# Altium schematic symbol library Capacitor - Aluminium TH.SchLib: 4591 symbols (part 21 of 27) (continued)
## UPM1J331MHD1TO (continued)
CAP ALUM 330UF 20% 63V RADIAL; Part Number: UPM1J331MHD1TO; Manufacturer: Nichicon; TemperatureRange: -55C ~ 105C; Type: Polar; Ripple Current: 1.09A @ 120Hz; Impedance: 49 mOhm; Value: 330uF; PartId: 23962; Supplier 1: Digi-Key; Supplier Part Number 1: 493-12152-1-ND; ComponentLink1Description: Datasheet; ComponentLink1URL: http://nichicon-us.com/english/products/pdfs/e-upm.pdf; ComponentLink2Description: Digi-Key Listing; ComponentLink2URL: https://www.digikey.com/product-detail/en/nichicon/UPM1J331MHD1TO/493-12152-1-ND/4319624; Tolerance: 20%; Voltage: 63V; Price: 0.98; Device Package: Radial, Can, 12.5mm
footprint CAP AL TH D12.5 L5 H27
pins: 1, 2

## UPM1J391MHD
designator C?, comment 390uF  (value not drawn)
CAP ALUM 390UF 20% 63V RADIAL; Part Number: UPM1J391MHD; Manufacturer: Nichicon; TemperatureRange: -55C ~ 105C; Type: Polar; Ripple Current: 1.26A @ 120Hz; Impedance: 43 mOhm; Value: 390uF; PartId: 24259; Supplier 1: Digi-Key; Supplier Part Number 1: 493-5618-ND; ComponentLink1Description: Datasheet; ComponentLink1URL: http://nichicon-us.com/english/products/pdfs/e-upm.pdf; ComponentLink2Description: Digi-Key Listing; ComponentLink2URL: https://www.digikey.com/product-detail/en/nichicon/UPM1J391MHD/493-5618-ND/2599683; Tolerance: 20%; Voltage: 63V; Price: 1.03; Device Package: Radial, Can, 12.5mm
footprint CAP AL TH D12.5 L5 H35.5
pins: 1, 2

## UPM1J471MHD6TN
designator C?, comment 470uF  (value not drawn)
CAP ALUM 470UF 20% 63V RADIAL; Part Number: UPM1J471MHD6TN; Manufacturer: Nichicon; TemperatureRange: -55C ~ 105C; Type: Polar; Ripple Current: 1.36A @ 120Hz; Impedance: 42 mOhm; Value: 470uF; PartId: 26772; Supplier 1: Digi-Key; Supplier Part Number 1: 493-7403-3-ND; ComponentLink1Description: Datasheet; ComponentLink1URL: http://nichicon-us.com/english/products/pdfs/e-upm.pdf; ComponentLink2Description: Digi-Key Listing; ComponentLink2URL: https://www.digikey.com/product-detail/en/nichicon/UPM1J471MHD6TN/493-7403-3-ND/3768716; Tolerance: 20%; Voltage: 63V; Price: 0.62; Device Package: Radial, Can, 16mm
footprint CAP AL TH D16 L7.5 H27
pins: 1, 2

## UPM1J560MPD6TD
designator C?, comment 56uF  (value not drawn)
CAP ALUM 56UF 20% 63V RADIAL; Part Number: UPM1J560MPD6TD; Manufacturer: Nichicon; TemperatureRange: -55C ~ 105C; Type: Polar; Ripple Current: 275mA @ 120Hz; Impedance: 230 mOhm; Value: 56uF; PartId: 24894; Supplier 1: Digi-Key; Supplier Part Number 1: 493-11793-1-ND; ComponentLink1Description: Datasheet; ComponentLink1URL: http://nichicon-us.com/english/products/pdfs/e-upm.pdf; ComponentLink2Description: Digi-Key Listing; ComponentLink2URL: https://www.digikey.com/product-detail/en/nichicon/UPM1J560MPD6TD/493-11793-1-ND/4319630; Tolerance: 20%; Voltage: 63V; Price: 0.48; Device Package: Radial, Can, 10mm
footprint CAP AL TH D10 L5 H14.5
pins: 1, 2

## UPM1J680MPD6TD
designator C?, comment 68uF  (value not drawn)
CAP ALUM 68UF 20% 63V RADIAL; Part Number: UPM1J680MPD6TD; Manufacturer: Nichicon; TemperatureRange: -55C ~ 105C; Type: Polar; Ripple Current: 310mA @ 120Hz; Impedance: 190 mOhm; Value: 68uF; PartId: 24577; Supplier 1: Digi-Key; Supplier Part Number 1: 493-11835-3-ND; ComponentLink1Description: Datasheet; ComponentLink1URL: http://nichicon-us.com/english/products/pdfs/e-upm.pdf; ComponentLink2Description: Digi-Key Listing; ComponentLink2URL: https://www.digikey.com/product-detail/en/nichicon/UPM1J680MPD6TD/493-11835-3-ND/4320978; Tolerance: 20%; Voltage: 63V; Price: 0.1612; Device Package: Radial, Can, 10mm
footprint CAP AL TH D10 L5 H14.5
pins: 1, 2

## UPM1J681MHD
designator C?, comment 680uF  (value not drawn)
CAP ALUM 680UF 20% 63V RADIAL; Part Number: UPM1J681MHD; Manufacturer: Nichicon; TemperatureRange: -55C ~ 105C; Type: Polar; Ripple Current: 1.7A @ 120Hz; Impedance: 32 mOhm; Value: 680uF; PartId: 27020; Supplier 1: Digi-Key; Supplier Part Number 1: 493-5619-ND; ComponentLink1Description: Datasheet; ComponentLink1URL: http://nichicon-us.com/english/products/pdfs/e-upm.pdf; ComponentLink2Description: Digi-Key Listing; ComponentLink2URL: https://www.digikey.com/product-detail/en/nichicon/UPM1J681MHD/493-5619-ND/2599693; Tolerance: 20%; Voltage: 63V; Price: 1.45; Device Package: Radial, Can, 16mm
footprint CAP AL TH D16 L7.5 H33.5
pins: 1, 2

## UPM1J820MPD6TD
designator C?, comment 82uF  (value not drawn)
CAP ALUM 82UF 20% 63V RADIAL; Part Number: UPM1J820MPD6TD; Manufacturer: Nichicon; TemperatureRange: -55C ~ 105C; Type: Polar; Ripple Current: 375mA @ 120Hz; Impedance: 160 mOhm; Value: 82uF; PartId: 25066; Supplier 1: Digi-Key; Supplier Part Number 1: 493-5266-3-ND; ComponentLink1Description: Datasheet; ComponentLink1URL: http://nichicon-us.com/english/products/pdfs/e-upm.pdf; ComponentLink2Description: Digi-Key Listing; ComponentLink2URL: https://www.digikey.com/product-detail/en/nichicon/UPM1J820MPD6TD/493-5266-3-ND/3130271; Tolerance: 20%; Voltage: 63V; Price: 0.225; Device Package: Radial, Can, 10mm
footprint CAP AL TH D10 L5 H17.5
pins: 1, 2

## UPM1K101MHD6TO
designator C?, comment 100uF  (value not drawn)
CAP ALUM 100UF 20% 80V RADIAL; Part Number: UPM1K101MHD6TO; Manufacturer: Nichicon; TemperatureRange: -55C ~ 105C; Type: Polar; Ripple Current: 400mA @ 120Hz; Impedance: 230 mOhm; Value: 100uF; PartId: 22812; Supplier 1: Digi-Key; Supplier Part Number 1: 493-12056-1-ND; ComponentLink1Description: Datasheet; ComponentLink1URL: http://nichicon-us.com/english/products/pdfs/e-upm.pdf; ComponentLink2Description: Digi-Key Listing; ComponentLink2URL: https://www.digikey.com/product-detail/en/nichicon/UPM1K101MHD6TO/493-12056-1-ND/4319634; Tolerance: 20%; Voltage: 80V; Price: 0; Device Package: Radial, Can, 12.5mm
footprint CAP AL TH D12.5 L5 H17.5
pins: 1, 2

## UPM1K121MHD6TN
designator C?, comment 120uF  (value not drawn)
CAP ALUM 120UF 20% 80V RADIAL; Part Number: UPM1K121MHD6TN; Manufacturer: Nichicon; TemperatureRange: -55C ~ 105C; Type: Polar; Ripple Current: 445mA @ 120Hz; Impedance: 200 mOhm; Value: 120uF; PartId: 26268; Supplier 1: Digi-Key; Supplier Part Number 1: 493-5269-3-ND; ComponentLink1Description: Datasheet; ComponentLink1URL: http://nichicon-us.com/english/products/pdfs/e-upm.pdf; ComponentLink2Description: Digi-Key Listing; ComponentLink2URL: https://www.digikey.com/product-detail/en/nichicon/UPM1K121MHD6TN/493-5269-3-ND/3130274; Tolerance: 20%; Voltage: 80V; Price: 0.514; Device Package: Radial, Can, 16mm
footprint CAP AL TH D16 L7.5 H20
pins: 1, 2

## UPM1K151MHD6TN
designator C?, comment 150uF  (value not drawn)
CAP ALUM 150UF 20% 80V RADIAL; Part Number: UPM1K151MHD6TN; Manufacturer: Nichicon; TemperatureRange: -55C ~ 105C; Type: Polar; Ripple Current: 470mA @ 120Hz; Impedance: 180 mOhm; Value: 150uF; PartId: 26275; Supplier 1: Digi-Key; Supplier Part Number 1: 493-5271-3-ND; ComponentLink1Description: Datasheet; ComponentLink1URL: http://nichicon-us.com/english/products/pdfs/e-upm.pdf; ComponentLink2Description: Digi-Key Listing; ComponentLink2URL: https://www.digikey.com/product-detail/en/nichicon/UPM1K151MHD6TN/493-5271-3-ND/3130276; Tolerance: 20%; Voltage: 80V; Price: 0.5838; Device Package: Radial, Can, 16mm
footprint CAP AL TH D16 L7.5 H20
pins: 1, 2

## UPM1K181MHD1TO
designator C?, comment 180uF  (value not drawn)
CAP ALUM 180UF 20% 80V RADIAL; Part Number: UPM1K181MHD1TO; Manufacturer: Nichicon; TemperatureRange: -55C ~ 105C; Type: Polar; Ripple Current: 735mA @ 120Hz; Impedance: 130 mOhm; Value: 180uF; PartId: 23826; Supplier 1: Digi-Key; Supplier Part Number 1: 493-5273-3-ND; ComponentLink1Description: Datasheet; ComponentLink1URL: http://nichicon-us.com/english/products/pdfs/e-upm.pdf; ComponentLink2Description: Digi-Key Listing; ComponentLink2URL: https://www.digikey.com/product-detail/en/nichicon/UPM1K181MHD1TO/493-5273-3-ND/3130278; Tolerance: 20%; Voltage: 80V; Price: 0.4493; Device Package: Radial, Can, 12.5mm
footprint CAP AL TH D12.5 L5 H27
pins: 1, 2

## UPM1K221MHD
designator C?, comment 220uF  (value not drawn)
CAP ALUM 220UF 20% 80V RADIAL; Part Number: UPM1K221MHD; Manufacturer: Nichicon; TemperatureRange: -55C ~ 105C; Type: Polar; Ripple Current: 845mA @ 120Hz; Impedance: 120 mOhm; Value: 220uF; PartId: 24234; Supplier 1: Digi-Key; Supplier Part Number 1: 493-5622-ND; ComponentLink1Description: Datasheet; ComponentLink1URL: http://nichicon-us.com/english/products/pdfs/e-upm.pdf; ComponentLink2Description: Digi-Key Listing; ComponentLink2URL: https://www.digikey.com/product-detail/en/nichicon/UPM1K221MHD/493-5622-ND/2599713; Tolerance: 20%; Voltage: 80V; Price: 0.98; Device Package: Radial, Can, 12.5mm
footprint CAP AL TH D12.5 L5 H35.5
pins: 1, 2

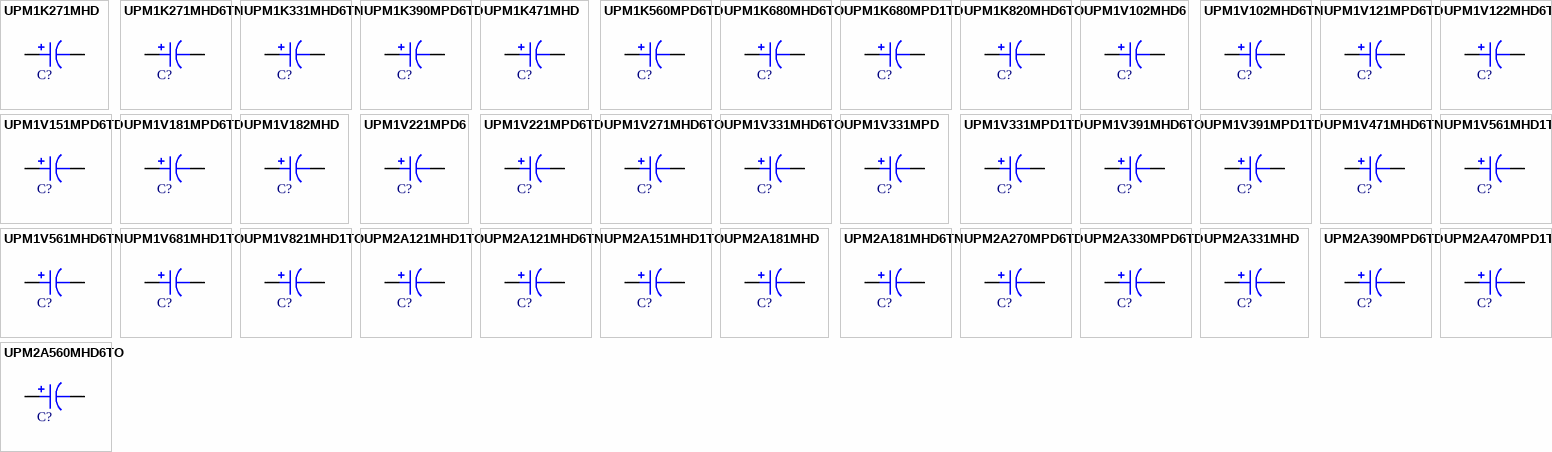
[diagram p88: symbols UPM1K271MHD to UPM2A560MHD6TO]

## UPM1K271MHD
designator C?, comment 270uF  (value not drawn)
CAP ALUM 270UF 20% 80V RADIAL; Part Number: UPM1K271MHD; Manufacturer: Nichicon; TemperatureRange: -55C ~ 105C; Type: Polar; Ripple Current: 945mA @ 120Hz; Impedance: 100 mOhm; Value: 270uF; PartId: 24273; Supplier 1: Digi-Key; Supplier Part Number 1: 493-5623-ND; ComponentLink1Description: Datasheet; ComponentLink1URL: http://nichicon-us.com/english/products/pdfs/e-upm.pdf; ComponentLink2Description: Digi-Key Listing; ComponentLink2URL: https://www.digikey.com/product-detail/en/nichicon/UPM1K271MHD/493-5623-ND/2599716; Tolerance: 20%; Voltage: 80V; Price: 1.06; Device Package: Radial, Can, 12.5mm
footprint CAP AL TH D12.5 L5 H35.5
pins: 1, 2

## UPM1K271MHD6TN
designator C?, comment 270uF  (value not drawn)
CAP ALUM 270UF 20% 80V RADIAL; Part Number: UPM1K271MHD6TN; Manufacturer: Nichicon; TemperatureRange: -55C ~ 105C; Type: Polar; Ripple Current: 920mA @ 120Hz; Impedance: 110 mOhm; Value: 270uF; PartId: 26353; Supplier 1: Digi-Key; Supplier Part Number 1: 493-5276-3-ND; ComponentLink1Description: Datasheet; ComponentLink1URL: http://nichicon-us.com/english/products/pdfs/e-upm.pdf; ComponentLink2Description: Digi-Key Listing; ComponentLink2URL: https://www.digikey.com/product-detail/en/nichicon/UPM1K271MHD6TN/493-5276-3-ND/3130281; Tolerance: 20%; Voltage: 80V; Price: 0.5065; Device Package: Radial, Can, 16mm
footprint CAP AL TH D16 L7.5 H22
pins: 1, 2

## UPM1K331MHD6TN
designator C?, comment 330uF  (value not drawn)
CAP ALUM 330UF 20% 80V RADIAL; Part Number: UPM1K331MHD6TN; Manufacturer: Nichicon; TemperatureRange: -55C ~ 105C; Type: Polar; Ripple Current: 1.1A @ 120Hz; Impedance: 99 mOhm; Value: 330uF; PartId: 26776; Supplier 1: Digi-Key; Supplier Part Number 1: 493-5277-3-ND; ComponentLink1Description: Datasheet; ComponentLink1URL: http://nichicon-us.com/english/products/pdfs/e-upm.pdf; ComponentLink2Description: Digi-Key Listing; ComponentLink2URL: https://www.digikey.com/product-detail/en/nichicon/UPM1K331MHD6TN/493-5277-3-ND/3130282; Tolerance: 20%; Voltage: 80V; Price: 0.6296; Device Package: Radial, Can, 16mm
footprint CAP AL TH D16 L7.5 H27
pins: 1, 2

## UPM1K390MPD6TD
designator C?, comment 39uF  (value not drawn)
CAP ALUM 39UF 20% 80V RADIAL; Part Number: UPM1K390MPD6TD; Manufacturer: Nichicon; TemperatureRange: -55C ~ 105C; Type: Polar; Ripple Current: 215mA @ 120Hz; Impedance: 490 mOhm; Value: 39uF; PartId: 24548; Supplier 1: Digi-Key; Supplier Part Number 1: 493-5279-3-ND; ComponentLink1Description: Datasheet; ComponentLink1URL: http://nichicon-us.com/english/products/pdfs/e-upm.pdf; ComponentLink2Description: Digi-Key Listing; ComponentLink2URL: https://www.digikey.com/product-detail/en/nichicon/UPM1K390MPD6TD/493-5279-3-ND/3130284; Tolerance: 20%; Voltage: 80V; Price: 0.148; Device Package: Radial, Can, 10mm
footprint CAP AL TH D10 L5 H14.5
pins: 1, 2

## UPM1K471MHD
designator C?, comment 470uF  (value not drawn)
CAP ALUM 470UF 20% 80V RADIAL; Part Number: UPM1K471MHD; Manufacturer: Nichicon; TemperatureRange: -55C ~ 105C; Type: Polar; Ripple Current: 1.43A @ 120Hz; Impedance: 69 mOhm; Value: 470uF; PartId: 27153; Supplier 1: Digi-Key; Supplier Part Number 1: 493-11131-ND; ComponentLink1Description: Datasheet; ComponentLink1URL: http://nichicon-us.com/english/products/pdfs/e-upm.pdf; ComponentLink2Description: Digi-Key Listing; ComponentLink2URL: https://www.digikey.com/product-detail/en/nichicon/UPM1K471MHD/493-11131-ND/2599727; Tolerance: 20%; Voltage: 80V; Price: 1.85; Device Package: Radial, Can, 16mm
footprint CAP AL TH D16 L7.5 H33.5
pins: 1, 2

## UPM1K560MPD6TD
designator C?, comment 56uF  (value not drawn)
CAP ALUM 56UF 20% 80V RADIAL; Part Number: UPM1K560MPD6TD; Manufacturer: Nichicon; TemperatureRange: -55C ~ 105C; Type: Polar; Ripple Current: 305mA @ 120Hz; Impedance: 360 mOhm; Value: 56uF; PartId: 25043; Supplier 1: Digi-Key; Supplier Part Number 1: 493-11901-3-ND; ComponentLink1Description: Datasheet; ComponentLink1URL: http://nichicon-us.com/english/products/pdfs/e-upm.pdf; ComponentLink2Description: Digi-Key Listing; ComponentLink2URL: https://www.digikey.com/product-detail/en/nichicon/UPM1K560MPD6TD/493-11901-3-ND/4321044; Tolerance: 20%; Voltage: 80V; Price: 0.192; Device Package: Radial, Can, 10mm
footprint CAP AL TH D10 L5 H17.5
pins: 1, 2

## UPM1K680MHD6TO
designator C?, comment 68uF  (value not drawn)
CAP ALUM 68UF 20% 80V RADIAL; Part Number: UPM1K680MHD6TO; Manufacturer: Nichicon; TemperatureRange: -55C ~ 105C; Type: Polar; Ripple Current: 325mA @ 120Hz; Impedance: 310 mOhm; Value: 68uF; PartId: 22809; Supplier 1: Digi-Key; Supplier Part Number 1: 493-5283-1-ND; ComponentLink1Description: Datasheet; ComponentLink1URL: http://nichicon-us.com/english/products/pdfs/e-upm.pdf; ComponentLink2Description: Digi-Key Listing; ComponentLink2URL: https://www.digikey.com/product-detail/en/nichicon/UPM1K680MHD6TO/493-5283-1-ND/3129620; Tolerance: 20%; Voltage: 80V; Price: 0; Device Package: Radial, Can, 12.5mm
footprint CAP AL TH D12.5 L5 H17.5
pins: 1, 2

## UPM1K680MPD1TD
designator C?, comment 68uF  (value not drawn)
CAP ALUM 68UF 20% 80V RADIAL; Part Number: UPM1K680MPD1TD; Manufacturer: Nichicon; TemperatureRange: -55C ~ 105C; Type: Polar; Ripple Current: 355mA @ 120Hz; Impedance: 280 mOhm; Value: 68uF; PartId: 25765; Supplier 1: Digi-Key; Supplier Part Number 1: 493-5284-3-ND; ComponentLink1Description: Datasheet; ComponentLink1URL: http://nichicon-us.com/english/products/pdfs/e-upm.pdf; ComponentLink2Description: Digi-Key Listing; ComponentLink2URL: https://www.digikey.com/product-detail/en/nichicon/UPM1K680MPD1TD/493-5284-3-ND/3130289; Tolerance: 20%; Voltage: 80V; Price: 0.2206; Device Package: Radial, Can, 10mm
footprint CAP AL TH D10 L5 H22
pins: 1, 2

## UPM1K820MHD6TO
designator C?, comment 82uF  (value not drawn)
CAP ALUM 82UF 20% 80V RADIAL; Part Number: UPM1K820MHD6TO; Manufacturer: Nichicon; TemperatureRange: -55C ~ 105C; Type: Polar; Ripple Current: 355mA @ 120Hz; Impedance: 270 mOhm; Value: 82uF; PartId: 22811; Supplier 1: Digi-Key; Supplier Part Number 1: 493-5286-1-ND; ComponentLink1Description: Datasheet; ComponentLink1URL: http://nichicon-us.com/english/products/pdfs/e-upm.pdf; ComponentLink2Description: Digi-Key Listing; ComponentLink2URL: https://www.digikey.com/product-detail/en/nichicon/UPM1K820MHD6TO/493-5286-1-ND/3129623; Tolerance: 20%; Voltage: 80V; Price: 0; Device Package: Radial, Can, 12.5mm
footprint CAP AL TH D12.5 L5 H17.5
pins: 1, 2

## UPM1V102MHD6
designator C?, comment 1000uF  (value not drawn)
CAP ALUM 1000UF 20% 35V RADIAL; Part Number: UPM1V102MHD6; Manufacturer: Nichicon; TemperatureRange: -55C ~ 105C; Type: Polar; Ripple Current: 1.53A @ 120Hz; Impedance: 34 mOhm; Value: 1000uF; PartId: 26441; Supplier 1: Digi-Key; Supplier Part Number 1: UPM1V102MHD6-ND; ComponentLink1Description: Datasheet; ComponentLink1URL: http://nichicon-us.com/english/products/pdfs/e-upm.pdf; ComponentLink2Description: Digi-Key Listing; ComponentLink2URL: https://www.digikey.com/product-detail/en/nichicon/UPM1V102MHD6/UPM1V102MHD6-ND/2599743; Tolerance: 20%; Voltage: 35V; Price: 1.37; Device Package: Radial, Can, 16mm
footprint CAP AL TH D16 L7.5 H22
pins: 1, 2

## UPM1V102MHD6TN
designator C?, comment 1000uF  (value not drawn)
CAP ALUM 1000UF 20% 35V RADIAL; Part Number: UPM1V102MHD6TN; Manufacturer: Nichicon; TemperatureRange: -55C ~ 105C; Type: Polar; Ripple Current: 1.53A @ 120Hz; Impedance: 34 mOhm; Value: 1000uF; PartId: 26371; Supplier 1: Digi-Key; Supplier Part Number 1: 493-12252-3-ND; ComponentLink1Description: Datasheet; ComponentLink1URL: http://nichicon-us.com/english/products/pdfs/e-upm.pdf; ComponentLink2Description: Digi-Key Listing; ComponentLink2URL: https://www.digikey.com/product-detail/en/nichicon/UPM1V102MHD6TN/493-12252-3-ND/4321395; Tolerance: 20%; Voltage: 35V; Price: 0.5792; Device Package: Radial, Can, 16mm
footprint CAP AL TH D16 L7.5 H22
pins: 1, 2

## UPM1V121MPD6TD
designator C?, comment 120uF  (value not drawn)
CAP ALUM 120UF 20% 35V RADIAL; Part Number: UPM1V121MPD6TD; Manufacturer: Nichicon; TemperatureRange: -55C ~ 105C; Type: Polar; Ripple Current: 425mA @ 120Hz; Impedance: 150 mOhm; Value: 120uF; PartId: 24550; Supplier 1: Digi-Key; Supplier Part Number 1: 493-5288-3-ND; ComponentLink1Description: Datasheet; ComponentLink1URL: http://nichicon-us.com/english/products/pdfs/e-upm.pdf; ComponentLink2Description: Digi-Key Listing; ComponentLink2URL: https://www.digikey.com/product-detail/en/nichicon/UPM1V121MPD6TD/493-5288-3-ND/3130293; Tolerance: 20%; Voltage: 35V; Price: 0.1484; Device Package: Radial, Can, 10mm
footprint CAP AL TH D10 L5 H14.5
pins: 1, 2

## UPM1V122MHD6TN
designator C?, comment 1200uF  (value not drawn)
CAP ALUM 1200UF 20% 35V RADIAL; Part Number: UPM1V122MHD6TN; Manufacturer: Nichicon; TemperatureRange: -55C ~ 105C; Type: Polar; Ripple Current: 1.92A @ 120Hz; Impedance: 31 mOhm; Value: 1200uF; PartId: 26783; Supplier 1: Digi-Key; Supplier Part Number 1: 493-5289-3-ND; ComponentLink1Description: Datasheet; ComponentLink1URL: http://nichicon-us.com/english/products/pdfs/e-upm.pdf; ComponentLink2Description: Digi-Key Listing; ComponentLink2URL: https://www.digikey.com/product-detail/en/nichicon/UPM1V122MHD6TN/493-5289-3-ND/3130294; Tolerance: 20%; Voltage: 35V; Price: 0.6568; Device Package: Radial, Can, 16mm
footprint CAP AL TH D16 L7.5 H27
pins: 1, 2

## UPM1V151MPD6TD
designator C?, comment 150uF  (value not drawn)
CAP ALUM 150UF 20% 35V RADIAL; Part Number: UPM1V151MPD6TD; Manufacturer: Nichicon; TemperatureRange: -55C ~ 105C; Type: Polar; Ripple Current: 475mA @ 120Hz; Impedance: 120 mOhm; Value: 150uF; PartId: 24546; Supplier 1: Digi-Key; Supplier Part Number 1: 493-11795-3-ND; ComponentLink1Description: Datasheet; ComponentLink1URL: http://nichicon-us.com/english/products/pdfs/e-upm.pdf; ComponentLink2Description: Digi-Key Listing; ComponentLink2URL: https://www.digikey.com/product-detail/en/nichicon/UPM1V151MPD6TD/493-11795-3-ND/4320938; Tolerance: 20%; Voltage: 35V; Price: 0.148; Device Package: Radial, Can, 10mm
footprint CAP AL TH D10 L5 H14.5
pins: 1, 2

## UPM1V181MPD6TD
designator C?, comment 180uF  (value not drawn)
CAP ALUM 180UF 20% 35V RADIAL; Part Number: UPM1V181MPD6TD; Manufacturer: Nichicon; TemperatureRange: -55C ~ 105C; Type: Polar; Ripple Current: 500mA @ 120Hz; Impedance: 110 mOhm; Value: 180uF; PartId: 25050; Supplier 1: Digi-Key; Supplier Part Number 1: 493-5290-3-ND; ComponentLink1Description: Datasheet; ComponentLink1URL: http://nichicon-us.com/english/products/pdfs/e-upm.pdf; ComponentLink2Description: Digi-Key Listing; ComponentLink2URL: https://www.digikey.com/product-detail/en/nichicon/UPM1V181MPD6TD/493-5290-3-ND/3130295; Tolerance: 20%; Voltage: 35V; Price: 0.2038; Device Package: Radial, Can, 10mm
footprint CAP AL TH D10 L5 H17.5
pins: 1, 2

## UPM1V182MHD
designator C?, comment 1800uF  (value not drawn)
CAP ALUM 1800UF 20% 35V RADIAL; Part Number: UPM1V182MHD; Manufacturer: Nichicon; TemperatureRange: -55C ~ 105C; Type: Polar; Ripple Current: 2.25A @ 120Hz; Impedance: 22 mOhm; Value: 1800uF; PartId: 27163; Supplier 1: Digi-Key; Supplier Part Number 1: 493-11132-ND; ComponentLink1Description: Datasheet; ComponentLink1URL: http://nichicon-us.com/english/products/pdfs/e-upm.pdf; ComponentLink2Description: Digi-Key Listing; ComponentLink2URL: https://www.digikey.com/product-detail/en/nichicon/UPM1V182MHD/493-11132-ND/2599753; Tolerance: 20%; Voltage: 35V; Price: 1.87; Device Package: Radial, Can, 16mm
footprint CAP AL TH D16 L7.5 H33.5
pins: 1, 2

## UPM1V221MPD6
designator C?, comment 220uF  (value not drawn)
CAP ALUM 220UF 20% 35V RADIAL; Part Number: UPM1V221MPD6; Manufacturer: Nichicon; TemperatureRange: -55C ~ 105C; Type: Polar; Ripple Current: 600mA @ 120Hz; Impedance: 90 mOhm; Value: 220uF; PartId: 25275; Supplier 1: Digi-Key; Supplier Part Number 1: UPM1V221MPD6-ND; ComponentLink1Description: Datasheet; ComponentLink1URL: http://nichicon-us.com/english/products/pdfs/e-upm.pdf; ComponentLink2Description: Digi-Key Listing; ComponentLink2URL: https://www.digikey.com/product-detail/en/nichicon/UPM1V221MPD6/UPM1V221MPD6-ND/2428074; Tolerance: 20%; Voltage: 35V; Price: 0.61; Device Package: Radial, Can, 10mm
footprint CAP AL TH D10 L5 H17.5
pins: 1, 2

## UPM1V221MPD6TD
designator C?, comment 220uF  (value not drawn)
CAP ALUM 220UF 20% 35V RADIAL; Part Number: UPM1V221MPD6TD; Manufacturer: Nichicon; TemperatureRange: -55C ~ 105C; Type: Polar; Ripple Current: 600mA @ 120Hz; Impedance: 90 mOhm; Value: 220uF; PartId: 25052; Supplier 1: Digi-Key; Supplier Part Number 1: 493-11934-3-ND; ComponentLink1Description: Datasheet; ComponentLink1URL: http://nichicon-us.com/english/products/pdfs/e-upm.pdf; ComponentLink2Description: Digi-Key Listing; ComponentLink2URL: https://www.digikey.com/product-detail/en/nichicon/UPM1V221MPD6TD/493-11934-3-ND/4321077; Tolerance: 20%; Voltage: 35V; Price: 0.2096; Device Package: Radial, Can, 10mm
footprint CAP AL TH D10 L5 H17.5
pins: 1, 2

## UPM1V271MHD6TO
designator C?, comment 270uF  (value not drawn)
CAP ALUM 270UF 20% 35V RADIAL; Part Number: UPM1V271MHD6TO; Manufacturer: Nichicon; TemperatureRange: -55C ~ 105C; Type: Polar; Ripple Current: 690mA @ 120Hz; Impedance: 80 mOhm; Value: 270uF; PartId: 22807; Supplier 1: Digi-Key; Supplier Part Number 1: 493-12023-1-ND; ComponentLink1Description: Datasheet; ComponentLink1URL: http://nichicon-us.com/english/products/pdfs/e-upm.pdf; ComponentLink2Description: Digi-Key Listing; ComponentLink2URL: https://www.digikey.com/product-detail/en/nichicon/UPM1V271MHD6TO/493-12023-1-ND/4319654; Tolerance: 20%; Voltage: 35V; Price: 0; Device Package: Radial, Can, 12.5mm
footprint CAP AL TH D12.5 L5 H17.5
pins: 1, 2

## UPM1V331MHD6TO
designator C?, comment 330uF  (value not drawn)
CAP ALUM 330UF 20% 35V RADIAL; Part Number: UPM1V331MHD6TO; Manufacturer: Nichicon; TemperatureRange: -55C ~ 105C; Type: Polar; Ripple Current: 780mA @ 120Hz; Impedance: 65 mOhm; Value: 330uF; PartId: 22806; Supplier 1: Digi-Key; Supplier Part Number 1: 493-12024-1-ND; ComponentLink1Description: Datasheet; ComponentLink1URL: http://nichicon-us.com/english/products/pdfs/e-upm.pdf; ComponentLink2Description: Digi-Key Listing; ComponentLink2URL: https://www.digikey.com/product-detail/en/nichicon/UPM1V331MHD6TO/493-12024-1-ND/4319657; Tolerance: 20%; Voltage: 35V; Price: 0; Device Package: Radial, Can, 12.5mm
footprint CAP AL TH D12.5 L5 H17.5
pins: 1, 2

## UPM1V331MPD
designator C?, comment 330uF  (value not drawn)
CAP ALUM 330UF 20% 35V RADIAL; Part Number: UPM1V331MPD; Manufacturer: Nichicon; TemperatureRange: -55C ~ 105C; Type: Polar; Ripple Current: 810mA @ 120Hz; Impedance: 60 mOhm; Value: 330uF; PartId: 25859; Supplier 1: Digi-Key; Supplier Part Number 1: UPM1V331MPD-ND; ComponentLink1Description: Datasheet; ComponentLink1URL: http://nichicon-us.com/english/products/pdfs/e-upm.pdf; ComponentLink2Description: Digi-Key Listing; ComponentLink2URL: https://www.digikey.com/product-detail/en/nichicon/UPM1V331MPD/UPM1V331MPD-ND/2428072; Tolerance: 20%; Voltage: 35V; Price: 0.59; Device Package: Radial, Can, 10mm
footprint CAP AL TH D10 L5 H22
pins: 1, 2

## UPM1V331MPD1TD
designator C?, comment 330uF  (value not drawn)
CAP ALUM 330UF 20% 35V RADIAL; Part Number: UPM1V331MPD1TD; Manufacturer: Nichicon; TemperatureRange: -55C ~ 105C; Type: Polar; Ripple Current: 810mA @ 120Hz; Impedance: 60 mOhm; Value: 330uF; PartId: 25752; Supplier 1: Digi-Key; Supplier Part Number 1: 493-11134-3-ND; ComponentLink1Description: Datasheet; ComponentLink1URL: http://nichicon-us.com/english/products/pdfs/e-upm.pdf; ComponentLink2Description: Digi-Key Listing; ComponentLink2URL: https://www.digikey.com/product-detail/en/nichicon/UPM1V331MPD1TD/493-11134-3-ND/3878178; Tolerance: 20%; Voltage: 35V; Price: 0.2026; Device Package: Radial, Can, 10mm
footprint CAP AL TH D10 L5 H22
pins: 1, 2

## UPM1V391MHD6TO
designator C?, comment 390uF  (value not drawn)
CAP ALUM 390UF 20% 35V RADIAL; Part Number: UPM1V391MHD6TO; Manufacturer: Nichicon; TemperatureRange: -55C ~ 105C; Type: Polar; Ripple Current: 825mA @ 120Hz; Impedance: 60 mOhm; Value: 390uF; PartId: 22805; Supplier 1: Digi-Key; Supplier Part Number 1: 493-12051-1-ND; ComponentLink1Description: Datasheet; ComponentLink1URL: http://nichicon-us.com/english/products/pdfs/e-upm.pdf; ComponentLink2Description: Digi-Key Listing; ComponentLink2URL: https://www.digikey.com/product-detail/en/nichicon/UPM1V391MHD6TO/493-12051-1-ND/4319660; Tolerance: 20%; Voltage: 35V; Price: 0; Device Package: Radial, Can, 12.5mm
footprint CAP AL TH D12.5 L5 H17.5
pins: 1, 2

## UPM1V391MPD1TD
designator C?, comment 390uF  (value not drawn)
CAP ALUM 390UF 20% 35V RADIAL; Part Number: UPM1V391MPD1TD; Manufacturer: Nichicon; TemperatureRange: -55C ~ 105C; Type: Polar; Ripple Current: 980mA @ 120Hz; Impedance: 55 mOhm; Value: 390uF; PartId: 26013; Supplier 1: Digi-Key; Supplier Part Number 1: 493-7405-2-ND; ComponentLink1Description: Datasheet; ComponentLink1URL: http://nichicon-us.com/english/products/pdfs/e-upm.pdf; ComponentLink2Description: Digi-Key Listing; ComponentLink2URL: https://www.digikey.com/product-detail/en/nichicon/UPM1V391MPD1TD/493-7405-2-ND/3768720; Tolerance: 20%; Voltage: 35V; Price: 0.2967; Device Package: Radial, Can, 10mm
footprint CAP AL TH D10 L5 H30
pins: 1, 2

## UPM1V471MHD6TN
designator C?, comment 470uF  (value not drawn)
CAP ALUM 470UF 20% 35V RADIAL; Part Number: UPM1V471MHD6TN; Manufacturer: Nichicon; TemperatureRange: -55C ~ 105C; Type: Polar; Ripple Current: 1.01A @ 120Hz; Impedance: 55 mOhm; Value: 470uF; PartId: 26269; Supplier 1: Digi-Key; Supplier Part Number 1: 493-12209-3-ND; ComponentLink1Description: Datasheet; ComponentLink1URL: http://nichicon-us.com/english/products/pdfs/e-upm.pdf; ComponentLink2Description: Digi-Key Listing; ComponentLink2URL: https://www.digikey.com/product-detail/en/nichicon/UPM1V471MHD6TN/493-12209-3-ND/4321352; Tolerance: 20%; Voltage: 35V; Price: 0.5376; Device Package: Radial, Can, 16mm
footprint CAP AL TH D16 L7.5 H20
pins: 1, 2

## UPM1V561MHD1TO
designator C?, comment 560uF  (value not drawn)
CAP ALUM 560UF 20% 35V RADIAL; Part Number: UPM1V561MHD1TO; Manufacturer: Nichicon; TemperatureRange: -55C ~ 105C; Type: Polar; Ripple Current: 1.17A @ 120Hz; Impedance: 41 mOhm; Value: 560uF; PartId: 23144; Supplier 1: Digi-Key; Supplier Part Number 1: 493-7406-2-ND; ComponentLink1Description: Datasheet; ComponentLink1URL: http://nichicon-us.com/english/products/pdfs/e-upm.pdf; ComponentLink2Description: Digi-Key Listing; ComponentLink2URL: https://www.digikey.com/product-detail/en/nichicon/UPM1V561MHD1TO/493-7406-2-ND/3768722; Tolerance: 20%; Voltage: 35V; Price: 0.2774; Device Package: Radial, Can, 12.5mm
footprint CAP AL TH D12.5 L5 H22
pins: 1, 2

## UPM1V561MHD6TN
designator C?, comment 560uF  (value not drawn)
CAP ALUM 560UF 20% 35V RADIAL; Part Number: UPM1V561MHD6TN; Manufacturer: Nichicon; TemperatureRange: -55C ~ 105C; Type: Polar; Ripple Current: 1.11A @ 120Hz; Impedance: 48 mOhm; Value: 560uF; PartId: 26270; Supplier 1: Digi-Key; Supplier Part Number 1: 493-12210-3-ND; ComponentLink1Description: Datasheet; ComponentLink1URL: http://nichicon-us.com/english/products/pdfs/e-upm.pdf; ComponentLink2Description: Digi-Key Listing; ComponentLink2URL: https://www.digikey.com/product-detail/en/nichicon/UPM1V561MHD6TN/493-12210-3-ND/4321353; Tolerance: 20%; Voltage: 35V; Price: 0.5376; Device Package: Radial, Can, 16mm
footprint CAP AL TH D16 L7.5 H20
pins: 1, 2

## UPM1V681MHD1TO
designator C?, comment 680uF  (value not drawn)
CAP ALUM 680UF 20% 35V RADIAL; Part Number: UPM1V681MHD1TO; Manufacturer: Nichicon; TemperatureRange: -55C ~ 105C; Type: Polar; Ripple Current: 1.41A @ 120Hz; Impedance: 36 mOhm; Value: 680uF; PartId: 24005; Supplier 1: Digi-Key; Supplier Part Number 1: 493-7407-1-ND; ComponentLink1Description: Datasheet; ComponentLink1URL: http://nichicon-us.com/english/products/pdfs/e-upm.pdf; ComponentLink2Description: Digi-Key Listing; ComponentLink2URL: https://www.digikey.com/product-detail/en/nichicon/UPM1V681MHD1TO/493-7407-1-ND/3768723; Tolerance: 20%; Voltage: 35V; Price: 1.05; Device Package: Radial, Can, 12.5mm
footprint CAP AL TH D12.5 L5 H27
pins: 1, 2

## UPM1V821MHD1TO
designator C?, comment 820uF  (value not drawn)
CAP ALUM 820UF 20% 35V RADIAL; Part Number: UPM1V821MHD1TO; Manufacturer: Nichicon; TemperatureRange: -55C ~ 105C; Type: Polar; Ripple Current: 1.49A @ 120Hz; Impedance: 32 mOhm; Value: 820uF; PartId: 24059; Supplier 1: Digi-Key; Supplier Part Number 1: 493-12213-1-ND; ComponentLink1Description: Datasheet; ComponentLink1URL: http://nichicon-us.com/english/products/pdfs/e-upm.pdf; ComponentLink2Description: Digi-Key Listing; ComponentLink2URL: https://www.digikey.com/product-detail/en/nichicon/UPM1V821MHD1TO/493-12213-1-ND/4319667; Tolerance: 20%; Voltage: 35V; Price: 1.17; Device Package: Radial, Can, 12.5mm
footprint CAP AL TH D12.5 L5 H27
pins: 1, 2

## UPM2A121MHD1TO
designator C?, comment 120uF  (value not drawn)
CAP ALUM 120UF 20% 100V RADIAL; Part Number: UPM2A121MHD1TO; Manufacturer: Nichicon; TemperatureRange: -55C ~ 105C; Type: Polar; Ripple Current: 700mA @ 120Hz; Impedance: 130 mOhm; Value: 120uF; PartId: 23827; Supplier 1: Digi-Key; Supplier Part Number 1: 493-5294-3-ND; ComponentLink1Description: Datasheet; ComponentLink1URL: http://nichicon-us.com/english/products/pdfs/e-upm.pdf; ComponentLink2Description: Digi-Key Listing; ComponentLink2URL: https://www.digikey.com/product-detail/en/nichicon/UPM2A121MHD1TO/493-5294-3-ND/3130299; Tolerance: 20%; Voltage: 100V; Price: 0.4493; Device Package: Radial, Can, 12.5mm
footprint CAP AL TH D12.5 L5 H27
pins: 1, 2

## UPM2A121MHD6TN
designator C?, comment 120uF  (value not drawn)
CAP ALUM 120UF 20% 100V RADIAL; Part Number: UPM2A121MHD6TN; Manufacturer: Nichicon; TemperatureRange: -55C ~ 105C; Type: Polar; Ripple Current: 535mA @ 120Hz; Impedance: 140 mOhm; Value: 120uF; PartId: 26277; Supplier 1: Digi-Key; Supplier Part Number 1: 493-5295-3-ND; ComponentLink1Description: Datasheet; ComponentLink1URL: http://nichicon-us.com/english/products/pdfs/e-upm.pdf; ComponentLink2Description: Digi-Key Listing; ComponentLink2URL: https://www.digikey.com/product-detail/en/nichicon/UPM2A121MHD6TN/493-5295-3-ND/3130300; Tolerance: 20%; Voltage: 100V; Price: 0.6498; Device Package: Radial, Can, 16mm
footprint CAP AL TH D16 L7.5 H20
pins: 1, 2

## UPM2A151MHD1TO
designator C?, comment 150uF  (value not drawn)
CAP ALUM 150UF 20% 100V RADIAL; Part Number: UPM2A151MHD1TO; Manufacturer: Nichicon; TemperatureRange: -55C ~ 105C; Type: Polar; Ripple Current: 780mA @ 120Hz; Impedance: 110 mOhm; Value: 150uF; PartId: 24041; Supplier 1: Digi-Key; Supplier Part Number 1: 493-12200-1-ND; ComponentLink1Description: Datasheet; ComponentLink1URL: http://nichicon-us.com/english/products/pdfs/e-upm.pdf; ComponentLink2Description: Digi-Key Listing; ComponentLink2URL: https://www.digikey.com/product-detail/en/nichicon/UPM2A151MHD1TO/493-12200-1-ND/4319671; Tolerance: 20%; Voltage: 100V; Price: 1.12; Device Package: Radial, Can, 12.5mm
footprint CAP AL TH D12.5 L5 H27
pins: 1, 2

## UPM2A181MHD
designator C?, comment 180uF  (value not drawn)